# Altium footprint library 2.51-DIP直插封装.PcbLib: 35 footprints (part 2 of 3)
Each footprint in its own frame and in the unit in brackets; x right, y up, seen from the top. Pads: shape width x height; smd on the part's side, far side on the other; paste and mask are expansions set on the pad; w line width, h text height; cw(c..) or ccw(c..) is an arc to the next point about the centre after c.
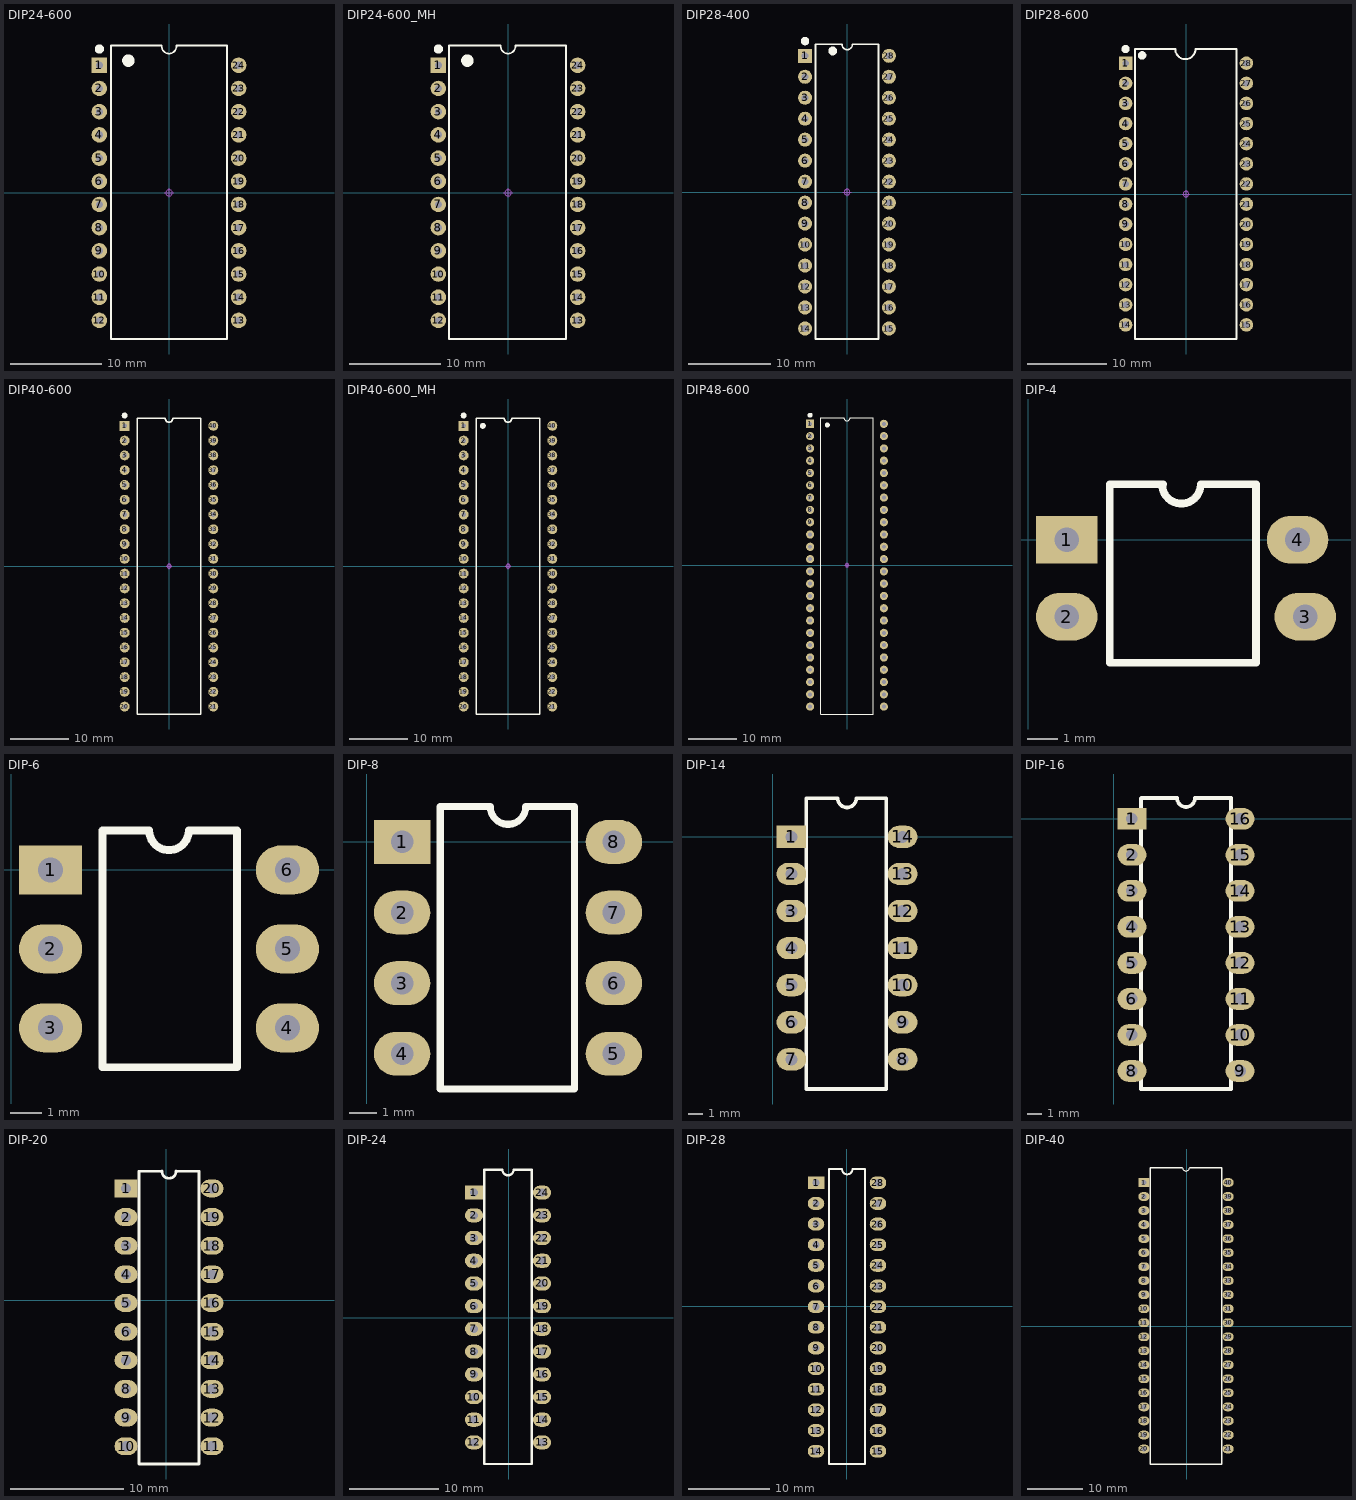
[diagram p1: the footprints below, top view; thin cyan lines are the x and y axes]

## DIP24-600 [mm] "32.5*15.24*3.8(长宽高）"
pads (24):
  rect 1.7x1.7 hole 0.8: 1(-7.62,13.97)
  round 1.7 hole 0.8: 2(-7.62,11.43) 3(-7.62,8.89) 4(-7.62,6.35) 5(-7.62,3.81) 6(-7.62,1.27) 7(-7.62,-1.27) 8(-7.62,-3.81) 9(-7.62,-6.35) 10(-7.62,-8.89) 11(-7.62,-11.43) 12(-7.62,-13.97) 13(7.62,-13.97) 14(7.62,-11.43) 15(7.62,-8.89) 16(7.62,-6.35) 17(7.62,-3.81) 18(7.62,-1.27) 19(7.62,1.27) 20(7.62,3.81) 21(7.62,6.35) 22(7.62,8.89) 23(7.62,11.43) 24(7.62,13.97)
Top Overlay:
  circle w0.508: c-7.62,15.748 r0.254
  circle w1: c-4.445,14.478 r0.18
  lines w0.2: -0.796,16.121 ccw(c0.004,16.044) 0.803,16.134 ; -0.796,16.14 -6.35,16.14 -6.35,-16.002 6.35,-16.002 6.35,16.14 0.803,16.14
Mechanical 15:
  circle w0.05: c0,0 r0.35
  lines w0.05: -0.5,0 0.5,0 ; 0,-0.5 0,0.5
3D body "DIP24-600.STEP": height 4.5, standoff -3.3, extent -7.73,-16.25 7.73,16.25

## DIP24-600_MH [mm] "带底座 32.5*15.24*3.8(长宽高）"
pads (24):
  rect 1.7x1.7 hole 0.8: 1(-7.62,13.97)
  round 1.7 hole 0.8: 2(-7.62,11.43) 3(-7.62,8.89) 4(-7.62,6.35) 5(-7.62,3.81) 6(-7.62,1.27) 7(-7.62,-1.27) 8(-7.62,-3.81) 9(-7.62,-6.35) 10(-7.62,-8.89) 11(-7.62,-11.43) 12(-7.62,-13.97) 13(7.62,-13.97) 14(7.62,-11.43) 15(7.62,-8.89) 16(7.62,-6.35) 17(7.62,-3.81) 18(7.62,-1.27) 19(7.62,1.27) 20(7.62,3.81) 21(7.62,6.35) 22(7.62,8.89) 23(7.62,11.43) 24(7.62,13.97)
Top Overlay:
  circle w1: c-4.445,14.478 r0.18
  circle w0.508: c-7.62,15.748 r0.254
  lines w0.2: -0.796,16.121 ccw(c0.004,16.044) 0.803,16.134 ; -0.796,16.14 -6.46,16.14 -6.46,-16.002 6.35,-16.002 6.35,16.14 0.803,16.14
Mechanical 15:
  circle w0.05: c0,0 r0.35
  lines w0.05: -0.5,0 0.5,0 ; 0,-0.5 0,0.5
3D body "DIP24-600.STEP": height 7.8, standoff 0, extent -7.73,-16.25 7.73,16.25
3D body "DIP-MH24-600.STEP": height 4.95, standoff -3.05, extent -8.845,-15.5 8.845,15.5

## DIP28-400 [mm] "36*10.16*3.8(长宽高）"
pads (28):
  rect 1.7x1.7 hole 0.8: 1(-5.08,16.51)
  round 1.7 hole 0.8: 2(-5.08,13.97) 3(-5.08,11.43) 4(-5.08,8.89) 5(-5.08,6.35) 6(-5.08,3.81) 7(-5.08,1.27) 8(-5.08,-1.27) 9(-5.08,-3.81) 10(-5.08,-6.35) 11(-5.08,-8.89) 12(-5.08,-11.43) 13(-5.08,-13.97) 14(-5.08,-16.51) 15(5.08,-16.51) 16(5.08,-13.97) 17(5.08,-11.43) 18(5.08,-8.89) 19(5.08,-6.35) 20(5.08,-3.81) 21(5.08,-1.27) 22(5.08,1.27) 23(5.08,3.81) 24(5.08,6.35) 25(5.08,8.89) 26(5.08,11.43) 27(5.08,13.97) 28(5.08,16.51)
Top Overlay:
  circle w0.8: c-1.727,17.094 r0.127
  circle w0.508: c-5.08,18.288 r0.254
  lines w0.2: -3.81,-17.78 -3.81,17.893 -0.61,17.893 ccw(c0.025,17.893) 0.66,17.893 3.81,17.893 3.81,-17.78 -3.81,-17.78
Mechanical 15:
  circle w0.05: c0,0 r0.35
  lines w0.05: -0.5,0 0.5,0 ; 0,-0.5 0,0.5
3D body "DIP28-400.STEP": height 4.5, standoff -3.4, extent -5.28,-17.923 5.28,18.077

## DIP28-600 [mm] "37.3*15.3*4长宽高）"
pads (28):
  rect 1.7x1.7 hole 0.8: 1(-7.62,16.51)
  round 1.7 hole 0.8: 2(-7.62,13.97) 3(-7.62,11.43) 4(-7.62,8.89) 5(-7.62,6.35) 6(-7.62,3.81) 7(-7.62,1.27) 8(-7.62,-1.27) 9(-7.62,-3.81) 10(-7.62,-6.35) 11(-7.62,-8.89) 12(-7.62,-11.43) 13(-7.62,-13.97) 14(-7.62,-16.51) 15(7.62,-16.51) 16(7.62,-13.97) 17(7.62,-11.43) 18(7.62,-8.89) 19(7.62,-6.35) 20(7.62,-3.81) 21(7.62,-1.27) 22(7.62,1.27) 23(7.62,3.81) 24(7.62,6.35) 25(7.62,8.89) 26(7.62,11.43) 27(7.62,13.97) 28(7.62,16.51)
Top Overlay:
  circle w0.8: c-5.537,17.49 r0.127
  circle w0.508: c-7.62,18.288 r0.254
  lines w0.254: -6.46,18.277 -6.46,-18.288 6.35,-18.288 6.35,18.288 1.185,18.288 cw(c-0.085,18.288) -1.355,18.288 -6.435,18.288
Mechanical 15:
  circle w0.05: c0,0 r0.35
  lines w0.05: -0.5,0 0.5,0 ; 0,-0.5 0,0.5
3D body "DIP28-600.STEP": height 4.7, standoff -3.2, extent -7.78,-18.65 7.78,18.65

## DIP40-600 [mm] "52*15.2*4mm(长宽高)"
pads (40):
  rect 1.7x1.7 hole 0.8: 1(-7.62,24.13)
  round 1.7 hole 0.8: 2(-7.62,21.59) 3(-7.62,19.05) 4(-7.62,16.51) 5(-7.62,13.97) 6(-7.62,11.43) 7(-7.62,8.89) 8(-7.62,6.35) 9(-7.62,3.81) 10(-7.62,1.27) 11(-7.62,-1.27) 12(-7.62,-3.81) 13(-7.62,-6.35) 14(-7.62,-8.89) 15(-7.62,-11.43) 16(-7.62,-13.97) 17(-7.62,-16.51) 18(-7.62,-19.05) 19(-7.62,-21.59) 20(-7.62,-24.13) 21(7.62,-24.13) 22(7.62,-21.59) 23(7.62,-19.05) 24(7.62,-16.51) 25(7.62,-13.97) 26(7.62,-11.43) 27(7.62,-8.89) 28(7.62,-6.35) 29(7.62,-3.81) 30(7.62,-1.27) 31(7.62,1.27) 32(7.62,3.81) 33(7.62,6.35) 34(7.62,8.89) 35(7.62,11.43) 36(7.62,13.97) 37(7.62,16.51) 38(7.62,19.05) 39(7.62,21.59) 40(7.62,24.13)
Top Overlay:
  circle w0.508: c-7.62,25.908 r0.254
  lines w0.254: -5.461,-25.4 -5.461,25.4 -0.635,25.4 ccw(c0,25.4) 0.635,25.4 5.461,25.4 5.461,-25.4 -5.461,-25.4
Mechanical 15:
  circle w0.05: c0,0 r0.35
  lines w0.05: -0.5,0 0.5,0 ; 0,-0.5 0,0.5
3D body "DIP40-600.STEP": height 4.7, standoff -3.2, extent -7.78,-26.176 7.78,26.176

## DIP40-600_MH [mm] "带底座 52*15.2*4mm(长宽高)"
pads (40):
  rect 1.7x1.7 hole 0.8: 1(-7.62,24.13)
  round 1.7 hole 0.8: 2(-7.62,21.59) 3(-7.62,19.05) 4(-7.62,16.51) 5(-7.62,13.97) 6(-7.62,11.43) 7(-7.62,8.89) 8(-7.62,6.35) 9(-7.62,3.81) 10(-7.62,1.27) 11(-7.62,-1.27) 12(-7.62,-3.81) 13(-7.62,-6.35) 14(-7.62,-8.89) 15(-7.62,-11.43) 16(-7.62,-13.97) 17(-7.62,-16.51) 18(-7.62,-19.05) 19(-7.62,-21.59) 20(-7.62,-24.13) 21(7.62,-24.13) 22(7.62,-21.59) 23(7.62,-19.05) 24(7.62,-16.51) 25(7.62,-13.97) 26(7.62,-11.43) 27(7.62,-8.89) 28(7.62,-6.35) 29(7.62,-3.81) 30(7.62,-1.27) 31(7.62,1.27) 32(7.62,3.81) 33(7.62,6.35) 34(7.62,8.89) 35(7.62,11.43) 36(7.62,13.97) 37(7.62,16.51) 38(7.62,19.05) 39(7.62,21.59) 40(7.62,24.13)
Top Overlay:
  circle w0.508: c-7.62,25.908 r0.254
  circle w0.508: c-4.318,24.13 r0.254
  lines w0.254: -5.461,-25.4 -5.461,25.4 -0.635,25.4 ccw(c0,25.4) 0.635,25.4 5.461,25.4 5.461,-25.4 -5.461,-25.4
Mechanical 15:
  circle w0.05: c0,0 r0.35
  lines w0.05: -0.5,0 0.5,0 ; 0,-0.5 0,0.5
3D body "DIP40-600.STEP": height 8.3, standoff 0.4, extent -7.78,-26.176 7.78,26.176
3D body "DIP-MH40-600.STEP": height 5.2, standoff -3, extent -8.9,-25.3 8.9,25.3

## DIP48-600 [mm] "61.49*15.24*3.8(长宽高）"
pads (48):
  rect 1.7x1.7 hole 0.8: 1(-7.62,29.21)
  round 1.7 hole 0.8: 2(-7.62,26.67) 3(-7.62,24.13) 4(-7.62,21.59) 5(-7.62,19.05) 6(-7.62,16.51) 7(-7.62,13.97) 8(-7.62,11.43) 9(-7.62,8.89) 10(-7.62,6.35) 11(-7.62,3.81) 12(-7.62,1.27) 13(-7.62,-1.27) 14(-7.62,-3.81) 15(-7.62,-6.35) 16(-7.62,-8.89) 17(-7.62,-11.43) 18(-7.62,-13.97) 19(-7.62,-16.51) 20(-7.62,-19.05) 21(-7.62,-21.59) 22(-7.62,-24.13) 23(-7.62,-26.67) 24(-7.62,-29.21) 25(7.62,-29.21) 26(7.62,-26.67) 27(7.62,-24.13) 28(7.62,-21.59) 29(7.62,-19.05) 30(7.62,-16.51) 31(7.62,-13.97) 32(7.62,-11.43) 33(7.62,-8.89) 34(7.62,-6.35) 35(7.62,-3.81) 36(7.62,-1.27) 37(7.62,1.27) 38(7.62,3.81) 39(7.62,6.35) 40(7.62,8.89) 41(7.62,11.43) 42(7.62,13.97) 43(7.62,16.51) 44(7.62,19.05) 45(7.62,21.59) 46(7.62,24.13) 47(7.62,26.67) 48(7.62,29.21)
Top Overlay:
  circle w0.508: c-4.064,28.956 r0.254
  circle w0.508: c-7.62,30.988 r0.254
  lines w0.254: -5.461,-30.734 5.461,-30.734 5.461,30.48 0.635,30.48 cw(c0,30.48) -0.635,30.48 -5.461,30.48 -5.461,-30.734
Mechanical 15:
  circle w0.05: c0,0 r0.35
  lines w0.05: -0.5,0 0.5,0 ; 0,-0.5 0,0.5
3D body "DIP48-600.STEP": height 4.7, standoff -3.2, extent -7.775,-30.745 7.775,30.745

## DIP-4 [mil] "淘宝ID:黄晶宝石   店铺网址:https://shop463601444.taobao.com"
pads (4):
  rect 80x62 hole 32: 1(50,0)
  oval 80x62 hole 32: 2(50,-100) 3(360,-100) 4(350,0)
Top Overlay:
  lines w10: 174,72 ccw(c199,72) 224,72 ; 175,72 106,72 106,-160 296,-160 296,72 225,72
3D body "SW3DPS-DIP4-DEFAULT.STEP": height 169.69, standoff -129.13, extent 46.52,-156 361.48,62.11

## DIP-6 [mil] "淘宝ID:黄晶宝石   店铺网址:https://shop463601444.taobao.com"
pads (6):
  rect 80x62 hole 32: 1(50,0)
  oval 80x62 hole 32: 2(50,-100) 3(50,-200) 4(350,-200) 5(350,-100) 6(350,0)
Top Overlay:
  lines w10: 116,-250 286,-250 286,50 225,50 cw(c200,50) 175,50 116,50 116,-250

## DIP-8 [mil]
pads (8):
  rect 80x62 / inner rect 100x50 / far side rect 80x62 hole 32: 1(50,0)
  oval 80x62 / inner oval 100x50 / far side oval 80x62 hole 32: 2(50,-100) 3(50,-200) 4(50,-300) 5(350,-300) 6(350,-200) 7(350,-100) 8(350,0)
Top Overlay:
  lines w10: 104,-350 294,-350 294,50 225,50 cw(c200,50) 175,50 104,50 104,-350
3D body "P0008A.stp": height 147.5, standoff -150.77, extent 37.01,-334.5 360,30.5

## DIP-14 [mil]
pads (14):
  rect 80x60 hole 32: 1(50,0)
  oval 80x60 hole 32: 2(50,-100) 3(50,-200) 7(50,-600) 8(350,-600) 9(350,-500) 10(350,-400) 11(350,-300) 12(350,-200) 13(350,-100) 14(350,0)
  oval 80x60 / inner oval 100x50 / far side oval 80x62 hole 32: 4(50,-300) 5(50,-400) 6(50,-500)
Top Overlay:
  lines w10: 175,102 173,104 90,104 90,-680 306,-680 306,104 225,104 cw(c200,104) 175,104
3D body "SW3dPS-DIP14-300.STEP": height 200, standoff -98.03, extent 50.16,-675.86 360,91.86

## DIP-16 [mil] "淘宝ID:黄晶宝石   店铺网址:https://shop463601444.taobao.com"
pads (16):
  rect 80x60 / inner rect 100x50 / far side rect 80x60 hole 32: 1(50,0)
  oval 80x60 / inner oval 100x50 / far side oval 80x60 hole 32: 2(50,-100) 3(50,-200) 4(50,-300) 5(50,-400) 6(50,-500) 7(50,-600) 8(50,-700) 9(350,-700) 10(350,-600) 11(350,-500) 12(350,-400) 13(350,-300) 14(350,-200) 15(350,-100) 16(350,0)
Top Overlay:
  lines w10: 174,58 76,58 75,57 75,-750 325,-750 325,58 ; 175,58 ccw(c200,58) 225,58 ; 226,58 324,58
3D body "SW3dPS-DIP16-300.STEP": height 200, standoff -98.03, extent 42.16,-743.7 352,43.7

## DIP-20 [mil] "淘宝ID:黄晶宝石   店铺网址:https://shop463601444.taobao.com"
pads (20):
  rect 80x62 hole 35.43: 1(-141,390)
  oval 80x62 hole 35.43: 2(-141,290) 3(-141,190) 4(-141,90) 5(-141,-10) 6(-141,-110) 7(-141,-210) 8(-141,-310) 9(-141,-410) 10(-141,-510) 11(159,-510) 12(159,-410) 13(159,-310) 14(159,-210) 15(159,-110) 16(159,-10) 17(159,90) 18(159,190) 19(159,290) 20(159,390)
Top Overlay:
  lines w10: -16,450 -95.33,450 -95.33,-572 113.33,-572 113.33,450 34,450 ; -16,450.13 ccw(c9,450.13) 34,450.13
3D body "User Library-DIP20-300-metric.STEP": height 177.17, standoff -137.8, extent -140.77,-565.87 164.77,442

## DIP-24 [mil] "淘宝ID:黄晶宝石   店铺网址:https://shop463601444.taobao.com"
pads (24):
  rect 80x62 hole 35.43: 1(-153,551)
  oval 80x62 hole 35.43: 2(-153,451) 3(-153,351) 4(-153,251) 5(-153,151) 6(-153,51) 7(-153,-49) 8(-153,-149) 9(-153,-249) 10(-153,-349) 11(-153,-449) 12(-153,-549) 13(147,-549) 14(147,-449) 15(147,-349) 16(147,-249) 17(147,-149) 18(147,-49) 19(147,51) 20(147,151) 21(147,251) 22(147,351) 23(147,451) 24(147,551)
Top Overlay:
  lines w10: -107.33,652 -107.33,-644 102,-644 102,652 22,652 cw(c-3,652) -28,652 -106,652
3D body "SW3dPS-DIP24-300.STEP": height 200, standoff -98.03, extent -158,-634.08 151.84,636

## DIP-28 [mil] "淘宝ID:黄晶宝石   店铺网址:https://shop463601444.taobao.com"
pads (28):
  rect 80x62 hole 35.43: 1(-148,598)
  oval 80x62 hole 35.43: 2(-148,498) 3(-148,398) 4(-148,298) 5(-148,198) 6(-148,98) 7(-148,-2) 8(-148,-102) 9(-148,-202) 10(-148,-302) 11(-148,-402) 12(-148,-502) 13(-148,-602) 14(-148,-702) 15(152,-702) 16(152,-602) 17(152,-502) 18(152,-402) 19(152,-302) 20(152,-202) 21(152,-102) 22(152,-2) 23(152,98) 24(152,198) 25(152,298) 26(152,398) 27(152,498) 28(152,598)
Top Overlay:
  lines w10: -23,664 -85.6,664 -85.6,-764 89.6,-764 89.6,662.4 88,664 28,664 cw(c3,664) -22,664
3D body "SW3dPS-DIP28-300.STEP": height 200, standoff -98.03, extent -149.84,-760.66 160,656.66

## DIP-40 [mil] "淘宝ID:黄晶宝石   店铺网址:https://shop463601444.taobao.com"
pads (40):
  rect 80x62 hole 35.43: 1(-304,1025)
  oval 80x62 hole 35.43: 2(-304,925) 3(-304,825) 4(-304,725) 5(-304,625) 6(-304,525) 7(-304,425) 8(-304,325) 9(-304,225) 10(-304,125) 11(-304,25) 12(-304,-75) 13(-304,-175) 14(-304,-275) 15(-304,-375) 16(-304,-475) 17(-304,-575) 18(-304,-675) 19(-304,-775) 20(-304,-875) 21(296,-875) 22(296,-775) 23(296,-675) 24(296,-575) 25(296,-475) 26(296,-375) 27(296,-275) 28(296,-175) 29(296,-75) 30(296,25) 31(296,125) 32(296,225) 33(296,325) 34(296,425) 35(296,525) 36(296,625) 37(296,725) 38(296,825) 39(296,925) 40(296,1025)
Top Overlay:
  lines w7.87: -29,1132.09 ccw(c-4,1132.09) 21,1132.09
  lines w10: -29,1132.09 -257.94,1132.09 -257.94,-982.09 249.94,-982.09 249.94,1132.09 21,1132.09
3D body "SW3dPS-DIP40-600.STEP": height 224.41, standoff -101.57, extent -305.84,-944.48 304,1120.48